# Altium footprint library ICs And Semiconductors SMD.PcbLib: 943 footprints (part 16 of 60)
Each footprint in its own frame and in the unit in brackets; x right, y up, seen from the top. Pads: shape width x height; smd on the part's side, far side on the other; paste and mask are expansions set on the pad; w line width, h text height; cw(c..) or ccw(c..) is an arc to the next point about the centre after c.
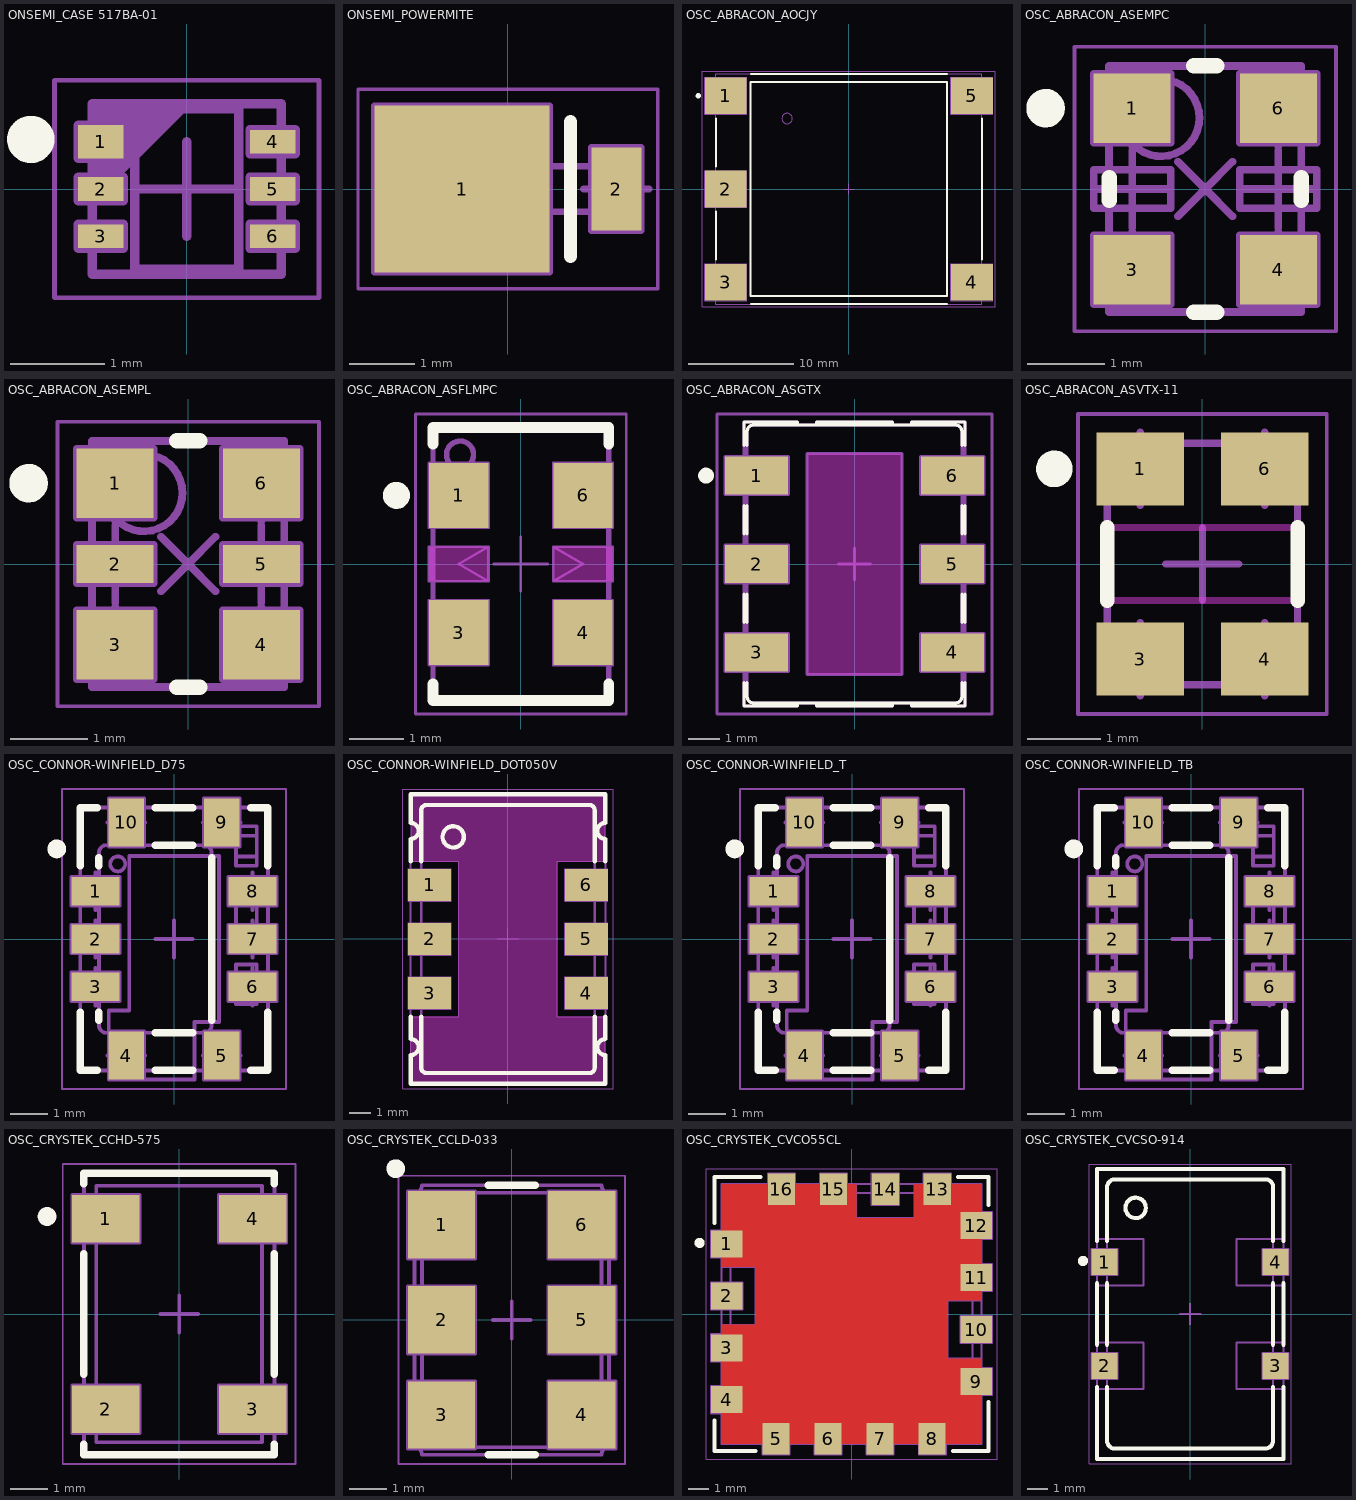
[diagram p15: the footprints below, top view; thin cyan lines are the x and y axes]

## ONSEMI_CASE 517BA-01 [mm] "SON, 0.50mm pitch, 6 pin, 2.0mm X 1.8mm X 0.6mm H body,  ON SEMICONDUCTOR Case 517BA-01"
height 0.6
pads (6):
  rect 0.48x0.35 smd: 1(-0.91,0.5)
  rect 0.48x0.25 smd: 2(-0.91,0) 3(-0.91,-0.5) 4(0.91,0.5) 5(0.91,0) 6(0.91,-0.5)
Top Overlay:
  circle w0.25: c-1.65,0.525 r0.125
Mechanical 8:
  lines w0.1: -0.5,0 0,0 ; 0,-0.5 0,0 ; 0,0.5 0,0 ; 0.5,0 0,0 ; -1.15,-0.625 -1.15,-0.375 ; -1.15,-0.625 -0.67,-0.625 -0.67,-0.375 -1.15,-0.375 ; -1.15,-0.625 -0.91,-0.5 -1.15,-0.375 ; -1.15,-0.125 -1.15,0.125 ; -1.15,-0.125 -0.67,-0.125 -0.67,0.125 -1.15,0.125 ; -1.15,-0.125 -0.91,0 -1.15,0.125 ; -1.15,0.325 -0.91,0.5 -1.15,0.675 ; -1.15,0.325 -0.67,0.325 -0.67,0.675 -1.15,0.675 ; -1.15,0.325 -1.15,0.675 ; 1.15,-0.625 0.67,-0.625 0.67,-0.375 1.15,-0.375 ; 1.15,-0.625 1.15,-0.375 ; 1.15,-0.625 0.91,-0.5 1.15,-0.375 ; 1.15,-0.125 0.67,-0.125 0.67,0.125 1.15,0.125 ; 1.15,-0.125 1.15,0.125 ; 1.15,-0.125 0.91,0 1.15,0.125 ; 1.15,0.375 0.67,0.375 0.67,0.625 1.15,0.625 ; 1.15,0.375 1.15,0.625 ; 1.15,0.375 0.91,0.5 1.15,0.625 ; -0.55,-0.85 -0.55,0.85 0.55,0.85 0.55,-0.85 -0.55,-0.85
Mechanical 14:
  lines w0.1: -1,-0.1 0,0.9 ; -1,0 -0.1,0.9 ; -1,0.1 -0.2,0.9 ; -1,0.2 -0.3,0.9 ; -1,0.3 -0.4,0.9 ; -1,0.4 -0.5,0.9 ; -1,0.5 -0.6,0.9 ; -1,0.6 -0.7,0.9 ; -1,0.7 -0.8,0.9 ; -1,0.8 -0.9,0.9 ; -1,-0.9 1,-0.9 1,0.9 -1,0.9 -1,-0.9
Mechanical 15:
  lines w0.05: -1.4,-1.15 1.4,-1.15 1.4,1.15 -1.4,1.15 -1.4,-1.15
3D body "ONSEMI_CASE 517BA-01.stp": height 0.6, standoff 0, extent -1,-0.9 1,0.9

## ONSEMI_POWERMITE [mil] "ON SEMICONDUCTOR POWERMITE Case, 2-Leads, Body 1.965 x 1.9mm"
height 45.28
pads (2):
  rect 105.12x100 smd: 1(-27.5,0)
  rect 30x50 smd: 2(65.06,0)
Top Overlay:
  lines w7.87: 37.56,-40.35 37.56,40.35
Mechanical 8:
  lines w3.94: -47.19,0 -27.5,0 ; -27.5,-19.68 -27.5,0 ; -27.5,19.69 -27.5,0 ; -19.68,0 0,0 ; 0,-19.69 0,0 ; 0,19.69 0,0 ; 19.69,0 0,0 ; 45.37,0 65.06,0 ; 65.06,-19.69 65.06,0 ; 65.06,19.69 65.06,0 ; 84.74,0 65.06,0 ; -80.06,-50 25.06,-50 25.06,50 -80.06,50 -80.06,-50 ; 50.06,-25 50.06,25 80.06,25 80.06,-25 50.06,-25
Mechanical 14:
  lines w3.94: -43.31,-37.4 -43.31,37.4 ; -41.34,-37.4 -41.34,37.4 ; -37.4,-37.4 -37.4,37.4 ; -35.43,-37.4 -35.43,37.4 ; -31.5,-37.4 -31.5,37.4 ; 20.28,-13.58 76.77,-13.58 76.77,13.58 20.28,13.58 ; -76.77,-19.69 -76.77,19.69 -57.09,19.69 -57.09,-19.69 -76.77,-19.69 ; -57.09,-37.4 20.28,-37.4 20.28,37.4 -57.09,37.4 -57.09,-37.4
Mechanical 15:
  lines w1.97: -89.9,-59.84 89.9,-59.84 89.9,59.84 -89.9,59.84 -89.9,-59.84
3D body "ONSEMI_POWERMITE.stp": height 45.28, standoff 0, extent -76.78,-37.4 76.77,37.4

## OSC_ABRACON_AOCJY [mm] "5 Pins, 25.4m x 22mm, SMD Oven Controlled Crystal Oscillator AICJY Series"
height 12.7
pads (5):
  rect 4x3.5 smd: 1(-11.75,8.9) 2(-11.75,0) 3(-11.75,-8.9) 4(11.75,-8.9) 5(11.75,8.9)
Top Overlay:
  circle w0.25: c-14.375,8.9 r0.125
  lines w0.2: -12.7,-6.75 -12.7,-2.15 ; -12.7,2.15 -12.7,6.75 ; -9.35,-11 9.35,-11 ; -9.35,11 9.35,11 ; 12.7,-6.75 12.7,6.75 ; -9.39,-10.23 -9.39,10.23 9.39,10.23 9.39,-10.23 -9.39,-10.23
Mechanical 8:
  lines w0.1: -12.25,-8.9 -11.75,-8.9 ; -12.25,0 -11.75,0 ; -12.25,8.9 -11.75,8.9 ; -11.75,-9.4 -11.75,-8.9 ; -11.75,-8.4 -11.75,-8.9 ; -11.75,-0.5 -11.75,0 ; -11.75,0.5 -11.75,0 ; -11.75,8.4 -11.75,8.9 ; -11.75,9.4 -11.75,8.9 ; -11.25,-8.9 -11.75,-8.9 ; -11.25,0 -11.75,0 ; -11.25,8.9 -11.75,8.9 ; -0.5,0 0,0 ; 0,-0.5 0,0 ; 0,0.5 0,0 ; 0.5,0 0,0 ; 11.25,-8.9 11.75,-8.9 ; 11.25,8.9 11.75,8.9 ; 11.75,-9.4 11.75,-8.9 ; 11.75,-8.4 11.75,-8.9 ; 11.75,8.4 11.75,8.9 ; 11.75,9.4 11.75,8.9 ; 12.25,-8.9 11.75,-8.9 ; 12.25,8.9 11.75,8.9 ; -13.75,-10.65 -13.75,-7.15 -9.75,-7.15 -9.75,-10.65 -13.75,-10.65 ; -13.75,-1.75 -13.75,1.75 -9.75,1.75 -9.75,-1.75 -13.75,-1.75 ; -13.75,7.15 -13.75,10.65 -9.75,10.65 -9.75,7.15 -13.75,7.15 ; 9.75,-10.65 9.75,-7.15 13.75,-7.15 13.75,-10.65 9.75,-10.65 ; 9.75,7.15 9.75,10.65 13.75,10.65 13.75,7.15 9.75,7.15
Mechanical 14:
  circle w0.1: c-5.89,6.73 r0.5
  lines w0.1: -12.7,-10.4 -12.65,-10.4 ccw(c-12.65,-8.9) -12.65,-7.4 -12.7,-7.4 ; -12.7,-1.5 -12.65,-1.5 ccw(c-12.65,0) -12.65,1.5 -12.7,1.5 ; -12.7,7.4 -12.65,7.4 ccw(c-12.65,8.9) -12.65,10.4 -12.7,10.4 ; 12.7,-10.4 12.65,-10.4 cw(c12.65,-8.9) 12.65,-7.4 12.7,-7.4 ; 12.7,7.4 12.65,7.4 cw(c12.65,8.9) 12.65,10.4 12.7,10.4 ; -12.7,-11 -12.7,-9.65 -12.65,-9.65 ccw(c-12.65,-8.9) -12.65,-8.15 -12.7,-8.15 -12.7,-0.75 -12.65,-0.75 ccw(c-12.65,0) -12.65,0.75 -12.7,0.75 -12.7,8.15 -12.65,8.15 ccw(c-12.65,8.9) -12.65,9.65 -12.7,9.65 -12.7,11 12.7,11 12.7,9.65 12.65,9.65 ccw(c12.65,8.9) 12.65,8.15 12.7,8.15 12.7,-8.15 12.65,-8.15 ccw(c12.65,-8.9) 12.65,-9.65 12.7,-9.65 12.7,-11 -12.7,-11 ; -9.39,-10.23 -9.39,10.23 9.39,10.23 9.39,-10.23 -9.39,-10.23
Mechanical 15:
  lines w0.05: -14,-11.25 -14,11.25 14,11.25 14,-11.25 -14,-11.25
3D body "OSC_ABRACON_AOCJY.stp": height 12.7, standoff 0, extent -12.7,-11 12.7,11

## OSC_ABRACON_ASEMPC [mm] "4 Pins, 3.2x2.5mm, Performance Plastic Package Ultra Miniature Pure Silicon Clock Oscillator, ASEMP Serie CMOS Version"
height 0.9
pads (4):
  rect 1x0.9 smd: 1(-0.95,1.05) 3(-0.95,-1.05) 4(0.95,-1.05) 6(0.95,1.05)
Top Overlay:
  circle w0.25: c-2.075,1.05 r0.125
  lines w0.2: -1.25,-0.15 -1.25,0.15 ; -0.15,-1.6 0.15,-1.6 ; -0.15,1.6 0.15,1.6 ; 1.25,-0.15 1.25,0.15
Mechanical 8:
  lines w0.1: -1.45,-1.05 -0.95,-1.05 ; -1.45,0 -0.95,0 ; -1.45,1.05 -0.95,1.05 ; -0.95,-1.55 -0.95,-1.05 ; -0.95,-0.55 -0.95,-1.05 ; -0.95,-0.5 -0.95,0 ; -0.95,0.5 -0.95,0 ; -0.95,0.55 -0.95,1.05 ; -0.95,1.55 -0.95,1.05 ; -0.45,-1.05 -0.95,-1.05 ; -0.45,0 -0.95,0 ; -0.45,1.05 -0.95,1.05 ; -0.354,-0.354 0,0 ; -0.354,0.354 0,0 ; 0.354,-0.354 0,0 ; 0.354,0.354 0,0 ; 0.45,-1.05 0.95,-1.05 ; 0.45,0 0.95,0 ; 0.45,1.05 0.95,1.05 ; 0.95,-1.55 0.95,-1.05 ; 0.95,-0.55 0.95,-1.05 ; 0.95,-0.5 0.95,0 ; 0.95,0.5 0.95,0 ; 0.95,0.55 0.95,1.05 ; 0.95,1.55 0.95,1.05 ; 1.45,-1.05 0.95,-1.05 ; 1.45,0 0.95,0 ; 1.45,1.05 0.95,1.05 ; -1.45,-1.5 -0.45,-1.5 -0.45,-0.6 -1.45,-0.6 -1.45,-1.5 ; -1.45,-0.25 -1.45,0.25 -0.45,0.25 -0.45,-0.25 -1.45,-0.25 ; -1.45,0.6 -0.45,0.6 -0.45,1.5 -1.45,1.5 -1.45,0.6 ; 0.45,-1.5 1.45,-1.5 1.45,-0.6 0.45,-0.6 0.45,-1.5 ; 0.45,-0.25 0.45,0.25 1.45,0.25 1.45,-0.25 0.45,-0.25 ; 0.45,0.6 1.45,0.6 1.45,1.5 0.45,1.5 0.45,0.6
Mechanical 14:
  circle w0.1: c-0.575,0.925 r0.5
  lines w0.1: -1.25,-1.6 1.25,-1.6 1.25,1.6 -1.25,1.6 -1.25,-1.6
Mechanical 15:
  lines w0.05: -1.7,-1.85 -1.7,1.85 1.7,1.85 1.7,-1.85 -1.7,-1.85
3D body "OSC_ABRACON_ASEMPC.stp": height 1, standoff 0, extent -1.25,-1.6 1.25,1.6

## OSC_ABRACON_ASEMPL [mm] "6 Pins, 3.2x2.5mm, Performance Plastic Package Ultra Miniature Pure Silicon Clock Oscillator ASEMP Serie"
height 0.9
pads (6):
  rect 1x0.9 smd: 1(-0.95,1.05) 3(-0.95,-1.05) 4(0.95,-1.05) 6(0.95,1.05)
  rect 1x0.5 smd: 2(-0.95,0) 5(0.95,0)
Top Overlay:
  circle w0.25: c-2.075,1.05 r0.125
  lines w0.2: -0.15,-1.6 0.15,-1.6 ; -0.15,1.6 0.15,1.6
Mechanical 8:
  lines w0.1: -1.45,-1.05 -0.95,-1.05 ; -1.45,0 -0.95,0 ; -1.45,1.05 -0.95,1.05 ; -0.95,-1.55 -0.95,-1.05 ; -0.95,-0.55 -0.95,-1.05 ; -0.95,-0.5 -0.95,0 ; -0.95,0.5 -0.95,0 ; -0.95,0.55 -0.95,1.05 ; -0.95,1.55 -0.95,1.05 ; -0.45,-1.05 -0.95,-1.05 ; -0.45,0 -0.95,0 ; -0.45,1.05 -0.95,1.05 ; -0.354,-0.354 0,0 ; -0.354,0.354 0,0 ; 0.354,-0.354 0,0 ; 0.354,0.354 0,0 ; 0.45,-1.05 0.95,-1.05 ; 0.45,0 0.95,0 ; 0.45,1.05 0.95,1.05 ; 0.95,-1.55 0.95,-1.05 ; 0.95,-0.55 0.95,-1.05 ; 0.95,-0.5 0.95,0 ; 0.95,0.5 0.95,0 ; 0.95,0.55 0.95,1.05 ; 0.95,1.55 0.95,1.05 ; 1.45,-1.05 0.95,-1.05 ; 1.45,0 0.95,0 ; 1.45,1.05 0.95,1.05 ; -1.45,-1.5 -1.45,-0.6 -0.45,-0.6 -0.45,-1.5 -1.45,-1.5 ; -1.45,-0.25 -0.45,-0.25 -0.45,0.25 -1.45,0.25 -1.45,-0.25 ; -1.45,0.6 -1.45,1.5 -0.45,1.5 -0.45,0.6 -1.45,0.6 ; 0.45,-1.5 0.45,-0.6 1.45,-0.6 1.45,-1.5 0.45,-1.5 ; 0.45,-0.25 1.45,-0.25 1.45,0.25 0.45,0.25 0.45,-0.25 ; 0.45,0.6 0.45,1.5 1.45,1.5 1.45,0.6 0.45,0.6
Mechanical 14:
  circle w0.1: c-0.575,0.925 r0.5
  lines w0.1: -1.25,-1.6 -1.25,1.6 1.25,1.6 1.25,-1.6 -1.25,-1.6
Mechanical 15:
  lines w0.05: -1.7,-1.85 1.7,-1.85 1.7,1.85 -1.7,1.85 -1.7,-1.85
3D body "OSC_ABRACON_ASEMPL.stp": height 1, standoff 0, extent -1.25,-1.6 1.25,1.6

## OSC_ABRACON_ASFLMPC [mm] "4 Pins, 5x3.2mm, Performance Plastic Package Ultra Miniature Pure Silicon Clock Oscillator, ASFLMPC Series, CMOS Version"
height 0.9
pads (4):
  rect 1.1x1.2 smd: 1(-1.15,1.27) 3(-1.15,-1.27) 4(1.15,-1.27) 6(1.15,1.27)
Top Layer keep-out:
  rectangle: -1.7,-0.32 -0.6,0.32
  rectangle: 0.6,-0.32 1.7,0.32
Top Overlay:
  circle w0.25: c-2.3,1.27 r0.125
  lines w0.2: -1.625,-2.22 -1.625,-2.525 1.625,-2.525 1.625,-2.22 ; -1.625,2.22 -1.625,2.525 1.625,2.525 1.625,2.22
Mechanical 8:
  lines w0.05: -1.65,-1.27 -1.15,-1.27 ; -1.65,1.27 -1.15,1.27 ; -1.15,-1.77 -1.15,-1.27 ; -1.15,-0.77 -1.15,-1.27 ; -1.15,0.77 -1.15,1.27 ; -1.15,1.77 -1.15,1.27 ; -0.65,-1.27 -1.15,-1.27 ; -0.65,1.27 -1.15,1.27 ; -0.5,0 0,0 ; 0,-0.5 0,0 ; 0,0.5 0,0 ; 0.5,0 0,0 ; 0.65,-1.27 1.15,-1.27 ; 0.65,1.27 1.15,1.27 ; 1.15,-1.77 1.15,-1.27 ; 1.15,-0.77 1.15,-1.27 ; 1.15,0.77 1.15,1.27 ; 1.15,1.77 1.15,1.27 ; 1.65,-1.27 1.15,-1.27 ; 1.65,1.27 1.15,1.27 ; -0.6,-0.32 -1.7,-0.32 -1.7,0.32 -0.6,0.32 ; -0.6,-0.32 -0.6,0.32 ; -0.6,-0.32 -1.15,0 -0.6,0.32 ; 0.6,-0.32 1.7,-0.32 1.7,0.32 0.6,0.32 ; 0.6,-0.32 0.6,0.32 ; 0.6,-0.32 1.15,0 0.6,0.32 ; -1.7,-1.87 -1.7,-0.67 -0.6,-0.67 -0.6,-1.87 -1.7,-1.87 ; -1.7,0.67 -1.7,1.87 -0.6,1.87 -0.6,0.67 -1.7,0.67 ; 0.6,-1.87 1.7,-1.87 1.7,-0.67 0.6,-0.67 0.6,-1.87 ; 0.6,0.67 1.7,0.67 1.7,1.87 0.6,1.87 0.6,0.67
Mechanical 14:
  circle w0.1: c-1.125,2.025 r0.25
  lines w0.1: -1.625,-2.525 -1.625,2.525 1.625,2.525 1.625,-2.525 -1.625,-2.525
Mechanical 15:
  lines w0.05: -1.95,-2.775 1.95,-2.775 1.95,2.775 -1.95,2.775 -1.95,-2.775
3D body "OSC_ABRACON_ASFLMPC.stp": height 0.9, standoff 0, extent -1.625,-2.525 1.625,2.525

## OSC_ABRACON_ASGTX [mm] "Configurable High Performance Crystal Oscillator ASGTX Series, SMD Oscillator, 6 pins, 9x7mm"
height 0.9
pads (6):
  rect 2x1.2 smd: 1(-3.1,2.8) 2(-3.1,0) 3(-3.1,-2.8) 4(3.1,-2.8) 5(3.1,0) 6(3.1,2.8)
Top Layer keep-out:
  rectangle: -1.5,-3.5 1.5,3.5
Top Overlay:
  circle w0.25: c-4.7,2.8 r0.125
  lines w0.1: -3.5,-3.75 -3.5,-4.5 -1.8,-4.5 -1.8,-4.4 ; -3.5,-1.85 -3.5,-0.95 ; -3.5,0.95 -3.5,1.85 ; -3.5,3.75 -3.5,4.5 -1.8,4.5 -1.8,4.4 ; -3.4,-3.75 -3.4,-4.2 ccw(c-3.2,-4.2) -3.2,-4.4 3.2,-4.4 ccw(c3.2,-4.2) 3.4,-4.2 3.4,-3.75 ; -3.4,-1.85 -3.4,-0.95 ; -3.4,0.95 -3.4,1.85 ; -3.4,3.75 -3.4,4.2 cw(c-3.2,4.2) -3.2,4.4 3.2,4.4 cw(c3.2,4.2) 3.4,4.2 3.4,3.75 ; -1.2,-4.4 -1.2,-4.5 1.2,-4.5 1.2,-4.4 ; -1.2,4.4 -1.2,4.5 1.2,4.5 1.2,4.4 ; 1.8,-4.4 1.8,-4.5 3.5,-4.5 3.5,-3.75 ; 1.8,4.4 1.8,4.5 3.5,4.5 3.5,3.75 ; 3.4,-1.85 3.4,-0.95 ; 3.4,0.95 3.4,1.85 ; 3.5,-1.85 3.5,-0.95 ; 3.5,0.95 3.5,1.85
Mechanical 8:
  lines w0.1: -3.6,-2.8 -3.1,-2.8 ; -3.6,0 -3.1,0 ; -3.6,2.8 -3.1,2.8 ; -3.1,-3.3 -3.1,-2.8 ; -3.1,-2.3 -3.1,-2.8 ; -3.1,-0.5 -3.1,0 ; -3.1,0.5 -3.1,0 ; -3.1,2.3 -3.1,2.8 ; -3.1,3.3 -3.1,2.8 ; -2.6,-2.8 -3.1,-2.8 ; -2.6,0 -3.1,0 ; -2.6,2.8 -3.1,2.8 ; -0.5,0 0,0 ; 0,-0.5 0,0 ; 0,0.5 0,0 ; 0.5,0 0,0 ; 2.6,-2.8 3.1,-2.8 ; 2.6,0 3.1,0 ; 2.6,2.8 3.1,2.8 ; 3.1,-3.3 3.1,-2.8 ; 3.1,-2.3 3.1,-2.8 ; 3.1,-0.5 3.1,0 ; 3.1,0.5 3.1,0 ; 3.1,2.3 3.1,2.8 ; 3.1,3.3 3.1,2.8 ; 3.6,-2.8 3.1,-2.8 ; 3.6,0 3.1,0 ; 3.6,2.8 3.1,2.8 ; -4.1,-3.4 -2.1,-3.4 -2.1,-2.2 -4.1,-2.2 -4.1,-3.4 ; -4.1,-0.6 -2.1,-0.6 -2.1,0.6 -4.1,0.6 -4.1,-0.6 ; -4.1,2.2 -2.1,2.2 -2.1,3.4 -4.1,3.4 -4.1,2.2 ; -1.5,-3.5 1.5,-3.5 1.5,3.5 -1.5,3.5 -1.5,-3.5 ; 2.1,-3.4 4.1,-3.4 4.1,-2.2 2.1,-2.2 2.1,-3.4 ; 2.1,-0.6 4.1,-0.6 4.1,0.6 2.1,0.6 2.1,-0.6 ; 2.1,2.2 4.1,2.2 4.1,3.4 2.1,3.4 2.1,2.2
Mechanical 14:
  lines w0.1: -3.4,-3.1 -3.5,-3.1 -3.5,-4.5 -1.8,-4.5 -1.8,-4.4 ; -3.4,-2.5 -3.5,-2.5 -3.5,-0.3 -3.4,-0.3 ; -3.4,0.3 -3.5,0.3 -3.5,2.5 -3.4,2.5 ; -3.4,3.1 -3.5,3.1 -3.5,4.5 -1.8,4.5 -1.8,4.4 ; -1.2,-4.4 -1.2,-4.5 1.2,-4.5 1.2,-4.4 ; -1.2,4.4 -1.2,4.5 1.2,4.5 1.2,4.4 ; 1.8,-4.4 1.8,-4.5 3.5,-4.5 3.5,-3.1 3.4,-3.1 ; 1.8,4.4 1.8,4.5 3.5,4.5 3.5,3.1 3.4,3.1 ; 3.4,-2.5 3.5,-2.5 3.5,-0.3 3.4,-0.3 ; 3.4,0.3 3.5,0.3 3.5,2.5 3.4,2.5 ; -3.4,-4.2 ccw(c-3.2,-4.2) -3.2,-4.4 3.2,-4.4 ccw(c3.2,-4.2) 3.4,-4.2 3.4,4.2 ccw(c3.2,4.2) 3.2,4.4 -3.2,4.4 ccw(c-3.2,4.2) -3.4,4.2 -3.4,-4.2
Mechanical 15:
  lines w0.1: -4.35,-4.75 4.35,-4.75 4.35,4.75 -4.35,4.75 -4.35,-4.75
3D body "OSC_ABRACON_ASGTX.stp": height 2.24, standoff 0, extent -3.5,-4.5 3.5,4.5

## OSC_ABRACON_ASVTX-11 [mm] "Voltage Controlled Temperature Compensated Crystal Oscillator ASVTX-11  Serie, SMD Oscillator, 4 pins, 3.2x2.5mm"
height 1
pads (4):
  rect 1.2x1 smd: 1(-0.85,1.3) 3(-0.85,-1.3) 4(0.85,-1.3) 6(0.85,1.3)
Top Layer keep-out:
  lines w0.1: -1.3,-0.5 -1.3,0.5 1.3,0.5 1.3,-0.5 -1.3,-0.5
Top Overlay:
  circle w0.25: c-2.025,1.3 r0.125
  lines w0.2: -1.3,-0.5 -1.3,0.5 ; 1.3,-0.5 1.3,0.5
Mechanical 8:
  lines w0.1: -1.35,-1.3 -0.85,-1.3 ; -1.35,1.3 -0.85,1.3 ; -0.85,-1.8 -0.85,-1.3 ; -0.85,-0.8 -0.85,-1.3 ; -0.85,0.8 -0.85,1.3 ; -0.85,1.8 -0.85,1.3 ; -0.5,0 0,0 ; -0.35,-1.3 -0.85,-1.3 ; -0.35,1.3 -0.85,1.3 ; 0,-0.5 0,0 ; 0,0.5 0,0 ; 0.35,-1.3 0.85,-1.3 ; 0.35,1.3 0.85,1.3 ; 0.5,0 0,0 ; 0.85,-1.8 0.85,-1.3 ; 0.85,-0.8 0.85,-1.3 ; 0.85,0.8 0.85,1.3 ; 0.85,1.8 0.85,1.3 ; 1.35,-1.3 0.85,-1.3 ; 1.35,1.3 0.85,1.3
Mechanical 14:
  circle w0.1: c-0.85,1.3 r0.2
  lines w0.1: -1.3,-1.65 1.3,-1.65 1.3,1.65 -1.3,1.65 -1.3,-1.65
Mechanical 15:
  lines w0.05: -1.7,-2.05 1.7,-2.05 1.7,2.05 -1.7,2.05 -1.7,-2.05
3D body "OSC_ABRACON_ASVTX-11.stp": height 1, standoff 0, extent -1.3,-1.65 1.3,1.65

## OSC_CONNOR-WINFIELD_D75 [mm] "SMD TCXO, Side Concave, 10 pins, 5.00x7.00mm, D75 Serie"
height 2
pads (10):
  rect 1.28x0.76 smd: 1(-2.09,1.27) 2(-2.09,0) 3(-2.09,-1.27) 6(2.09,-1.27) 7(2.09,0) 8(2.09,1.27)
  rect 0.94x1.28 smd: 4(-1.27,-3.105) 5(1.27,-3.105) 9(1.27,3.105) 10(-1.27,3.105)
Top Overlay:
  circle w0.25: c-3.125,2.4 r0.125
  lines w0.2: -2.5,-1.95 -2.5,-3.5 -2.04,-3.5 ; -2.5,1.95 -2.5,3.5 -2.04,3.5 ; -2,-2.165 -2,-1.95 ; -2,1.95 -2,2.165 ; -0.5,-3.5 0.5,-3.5 ; -0.5,-2.5 0.5,-2.5 ; -0.5,2.5 0.5,2.5 ; -0.5,3.5 0.5,3.5 ; 1,-2.165 1,2.165 ; 2.04,-3.5 2.5,-3.5 2.5,-1.95 ; 2.04,3.5 2.5,3.5 2.5,1.95
Mechanical 8:
  lines w0.1: -2.59,-1.27 -2.09,-1.27 ; -2.59,0 -2.09,0 ; -2.59,1.27 -2.09,1.27 ; -2.09,-1.77 -2.09,-1.27 ; -2.09,-0.77 -2.09,-1.27 ; -2.09,-0.5 -2.09,0 ; -2.09,0.5 -2.09,0 ; -2.09,0.77 -2.09,1.27 ; -2.09,1.77 -2.09,1.27 ; -1.77,-3.105 -1.27,-3.105 ; -1.77,3.105 -1.27,3.105 ; -1.59,-1.27 -2.09,-1.27 ; -1.59,0 -2.09,0 ; -1.59,1.27 -2.09,1.27 ; -1.27,-3.605 -1.27,-3.105 ; -1.27,-2.605 -1.27,-3.105 ; -1.27,2.605 -1.27,3.105 ; -1.27,3.605 -1.27,3.105 ; -0.77,-3.105 -1.27,-3.105 ; -0.77,3.105 -1.27,3.105 ; -0.5,0 0,0 ; 0,-0.5 0,0 ; 0,0.5 0,0 ; 0.5,0 0,0 ; 0.77,-3.105 1.27,-3.105 ; 0.77,3.105 1.27,3.105 ; 1.27,-3.605 1.27,-3.105 ; 1.27,-2.605 1.27,-3.105 ; 1.27,2.605 1.27,3.105 ; 1.27,3.605 1.27,3.105 ; 1.59,-1.27 2.09,-1.27 ; 1.59,0 2.09,0 ; 1.59,1.27 2.09,1.27 ; 1.77,-3.105 1.27,-3.105 ; 1.77,3.105 1.27,3.105 ; 2.09,-1.77 2.09,-1.27 ; 2.09,-0.77 2.09,-1.27 ; 2.09,-0.5 2.09,0 ; 2.09,0.5 2.09,0 ; 2.09,0.77 2.09,1.27 ; 2.09,1.77 2.09,1.27 ; 2.59,-1.27 2.09,-1.27 ; 2.59,0 2.09,0 ; 2.59,1.27 2.09,1.27 ; -1.74,-3.745 -0.8,-3.745 ; -1.74,-3.745 -1.74,-2.465 ; -1.74,-3.745 -1.74,-2.465 ; -1.74,-3.745 -0.8,-3.745 ; -1.74,-2.465 -0.8,-2.465 -0.8,-3.745 ; -1.74,-2.465 -1.74,-1.904 -1.196,-1.904 -1.196,2.211 1.196,2.211 1.196,-2.211 0.546,-2.211 0.546,-3.745 -0.8,-3.745 ; -2.73,-1.65 -2.73,-0.89 -1.45,-0.89 -1.45,-1.65 -2.73,-1.65 ; -2.73,-0.38 -2.73,0.38 -1.45,0.38 -1.45,-0.38 -2.73,-0.38 ; -2.73,0.89 -2.73,1.65 -1.45,1.65 -1.45,0.89 -2.73,0.89 ; -1.74,2.465 -1.74,3.745 -0.8,3.745 -0.8,2.465 -1.74,2.465 ; 0.8,-3.745 1.74,-3.745 1.74,-2.465 0.8,-2.465 0.8,-3.745 ; 0.8,2.465 0.8,3.745 1.74,3.745 1.74,2.465 0.8,2.465 ; 1.45,-1.65 2.73,-1.65 2.73,-0.89 1.45,-0.89 1.45,-1.65 ; 1.45,-0.38 2.73,-0.38 2.73,0.38 1.45,0.38 1.45,-0.38 ; 1.45,0.89 2.73,0.89 2.73,1.65 1.45,1.65 1.45,0.89
Mechanical 14:
  circle w0.1: c-1.5,2 r0.2